# Altium schematic symbol library Schlib.SchLib: 725 symbols (part 3 of 6) (continued)
## ERJ-2RKF8252X (continued)
SMD Chip Resistor, 82.5 kOhm, ± 1%, 100 mW, 0402 [1005 Metric], Thick Film, Precision; Manufacturer: Panasonic; Manufacturer Part Number: ERJ-2RKF8252X; Voltage Rating (DC): 50V; Supplier: Mouser; Supplier Part Number: 667-ERJ-2RKF8252X; RoHS: Yes; Category: Chip SMD Resistors; Stock: 47815; Pricing: 1=0.1, 10=0.016, 50=0.016, 100=0.009, 1000=0.007, 10000=0.004 (USD); Lead Free: 5698LeadFree; ComponentLink1URL: https://datasheet.ciiva.com/16760/70260748-16760431.pdf?src-supplier=Allied+Electronics; ComponentLink1Description: https://datasheet.ciiva.com/16760/70260748-16760431.pdf?src-supplier=Allied+Electronics; ComponentLink2URL: https://datasheet.ciiva.com/28548/1694929-28548459.pdf?src-supplier=Element14; ComponentLink2Description: https://datasheet.ciiva.com/28548/1694929-28548459.pdf?src-supplier=Element14; ComponentLink3URL: https://datasheet.ciiva.com/22668/1678782-22668155.pdf?src-supplier=Element14; ComponentLink3Description: https://datasheet.ciiva.com/22668/1678782-22668155.pdf?src-supplier=Element14; ComponentLink4URL: https://datasheet.ciiva.com/30193/aoa0000ce2-30193435.pdf?src-supplier=Onlinecomponents.com; ComponentLink4Description: https://datasheet.ciiva.com/30193/aoa0000ce2-30193435.pdf?src-supplier=Onlinecomponents.com; ComponentLink5URL: https://datasheet.ciiva.com/24124/aoa0000ce2-24124663.pdf?src-supplier=Mouser; ComponentLink5Description: https://datasheet.ciiva.com/24124/aoa0000ce2-24124663.pdf?src-supplier=Mouser; ComponentLink6URL: https://datasheet.ciiva.com/9187/aoa0000ce2-9187319.pdf?src-supplier=Avnet; ComponentLink6Description: https://datasheet.ciiva.com/9187/aoa0000ce2-9187319.pdf?src-supplier=Avnet; ComponentLink7URL: https://datasheet.ciiva.com/9187/aoa0000ce2-9187321.pdf?src-supplier=Avnet; ComponentLink7Description: https://datasheet.ciiva.com/9187/aoa0000ce2-9187321.pdf?src-supplier=Avnet; ComponentLink8URL: https://datasheet.ciiva.com/22774/1678782-22774092.pdf?src-supplier=Farnell; ComponentLink8Description: https://datasheet.ciiva.com/22774/1678782-22774092.pdf?src-supplier=Farnell; Case/Package: 0402
footprint R 0402 (1005 Metric) (Chip Capacitor, Body 1.0x0.5mm, IPC High Density)
pins: 1 B, 2 A

## ERJ-2RKF8452X
designator R?  value 84.5k  (hidden comment: *)
SMD Chip Resistor, 84.5 kOhm, ± 1%, 100 mW, 0402 [1005 Metric], Thick Film, Precision; Manufacturer: Panasonic; Manufacturer Part Number: ERJ-2RKF8452X; Voltage Rating (DC): 50V; Supplier: Mouser; Supplier Part Number: 667-ERJ-2RKF8452X; RoHS: Yes; Category: Chip SMD Resistors; Stock: 108500; Pricing: 1=0.1, 10=0.016, 50=0.016, 100=0.009, 1000=0.006, 10000=0.003 (USD); Lead Free: 5697LeadFree; ComponentLink1URL: https://datasheet.ciiva.com/24025/aoa0000ce2-24025517.pdf?src-supplier=Mouser; ComponentLink1Description: https://datasheet.ciiva.com/24025/aoa0000ce2-24025517.pdf?src-supplier=Mouser; ComponentLink2URL: https://datasheet.ciiva.com/46373/1678782-46373862.pdf?src-supplier=Element14; ComponentLink2Description: https://datasheet.ciiva.com/46373/1678782-46373862.pdf?src-supplier=Element14; ComponentLink3URL: https://datasheet.ciiva.com/46373/1678782-46373863.pdf?src-supplier=Element14; ComponentLink3Description: https://datasheet.ciiva.com/46373/1678782-46373863.pdf?src-supplier=Element14; ComponentLink4URL: https://datasheet.ciiva.com/22682/1678782-22682463.pdf?src-supplier=Element14; ComponentLink4Description: https://datasheet.ciiva.com/22682/1678782-22682463.pdf?src-supplier=Element14; ComponentLink5URL: https://datasheet.ciiva.com/7861/aoa0000ce2-7861999.pdf?src-supplier=Element14; ComponentLink5Description: https://datasheet.ciiva.com/7861/aoa0000ce2-7861999.pdf?src-supplier=Element14; ComponentLink6URL: https://datasheet.ciiva.com/28540/1694929-28540714.pdf?src-supplier=Element14; ComponentLink6Description: https://datasheet.ciiva.com/28540/1694929-28540714.pdf?src-supplier=Element14; Case/Package: 0402
footprint R 0402 (1005 Metric) (Chip Capacitor, Body 1.0x0.5mm, IPC High Density)
pins: 1 B, 2 A

## ERJ-2RKF8872X
designator R?  value 88.7kR  (hidden comment: *)
SMD Chip Resistor, 88.7 kOhm, ± 1%, 100 mW, 0402 [1005 Metric], Thick Film, Precision; Manufacturer: Panasonic; Manufacturer Part Number: ERJ-2RKF8872X; Voltage Rating (DC): 50V; Supplier: Future Electronics; Supplier Part Number: 9176712; RoHS: Yes; Category: Chip SMD Resistors; Stock: 90000; Pricing: 10000=0.0033, 40000=0.0031, 200000=0.0029, 400000=0.0028, 1250000=0.0026 (USD); Lead Free: 5697LeadFree; ComponentLink1URL: https://datasheet.ciiva.com/9187/aoa0000ce2-9187162.pdf?src-supplier=Avnet; ComponentLink1Description: https://datasheet.ciiva.com/9187/aoa0000ce2-9187162.pdf?src-supplier=Avnet; ComponentLink2URL: https://datasheet.ciiva.com/24069/aoa0000ce2-24069327.pdf?src-supplier=Mouser; ComponentLink2Description: https://datasheet.ciiva.com/24069/aoa0000ce2-24069327.pdf?src-supplier=Mouser; Case/Package: 0402
footprint R 0402 (1005 Metric) (Chip Capacitor, Body 1.0x0.5mm, IPC High Density)
pins: 1 B, 2 A

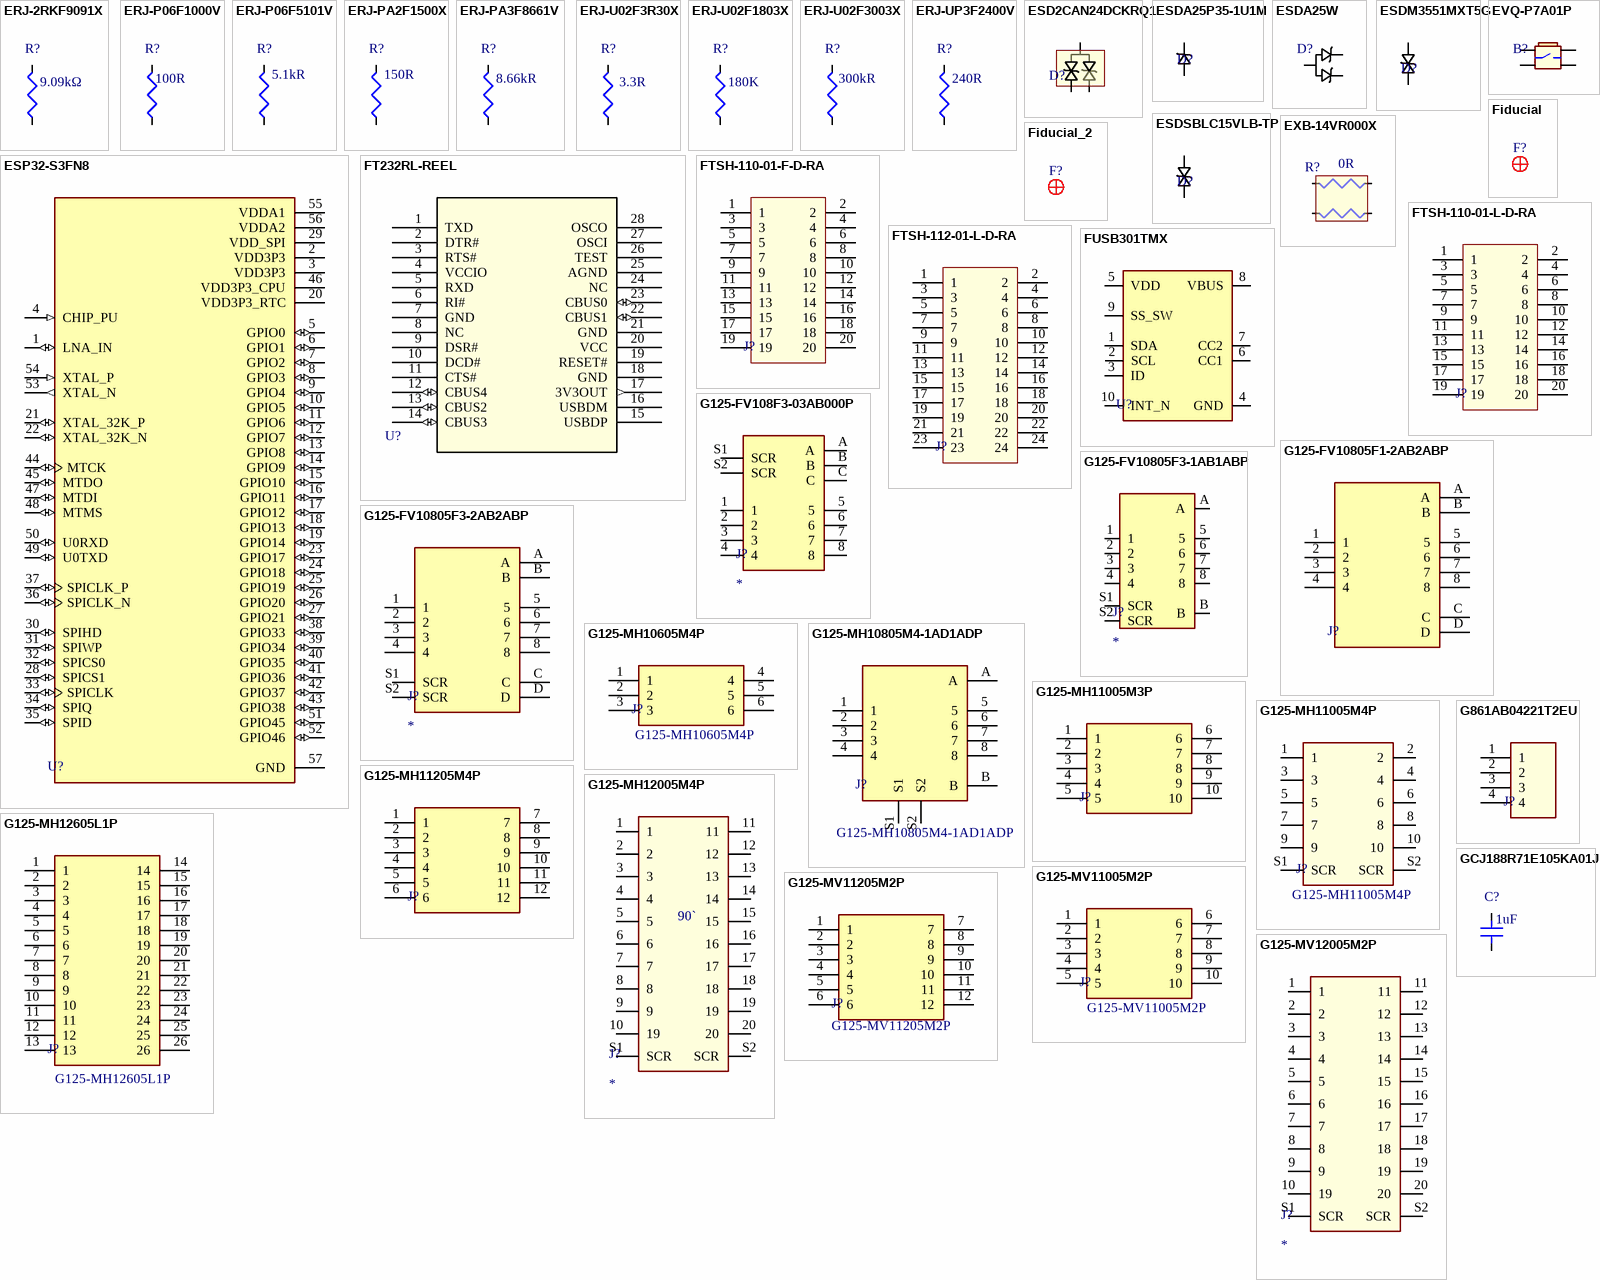
[diagram p10: symbols ERJ-2RKF9091X to GCJ188R71E105KA01J]

## ERJ-2RKF9091X
designator R?  value 9.09kΩ  (hidden comment: *)
Res Thick Film 0402 9.09K Ohm 1% 0.1W(1/10W) ±100ppm/°C Molded SMD Punched Carrier T/R; Manufacturer: Panasonic; Manufacturer Part Number: ERJ-2RKF9091X; Manufacturer Lifecycle Status: ACTIVE; Part Series: Precision Thick Film Chip Resistors; Max Power Dissipation: 100mW; Voltage Rating: 50V; Supplier: Arrow Electronics; Supplier Part Number: ERJ-2RKF9091X; RoHS: Compliant; Category: Chip SMD Resistors; Stock: 10000; Pricing: 10000=0.0039 (USD); Case/Package: 0402; Case Code (Imperial): 0402; China RoHS: Non-Compliant; Composition: Thick Film; Contact Plating: Tin; Depth: 500µm; Features: Automotive AEC-Q200; Height: 350µm; Length: 1mm; Lifecycle Status: Production; Max Operating Temperature: 155°C; Military Standard: Not; Min Operating Temperature: -55°C; Mounting Technology: Surface Mount; Number of Terminals: 2; Number of Terminations: 2; Packaging: Cut Tape; Power Dissipation: 100mW; Power Rating: 100mW; REACH SVHC: Yes; Schedule B: 8533210045, 8533210045|8533210045|8533210045|8533210045|8533210045|8533210045|8533210045|8533210045, 8533210045|8533210045|8533210045|8533210045|8533210045|8533210045|8533210045|8533210045|8533210045, 8533210045|8533210045|8533210045|8533210045|8533210045|8533210045|8533210045|8533210045|8533210045|8533210045; Temperature Coefficient: 100ppm/°C; Termination: SMD/SMT; Tolerance: 1%; Voltage Rating (DC): 50V; Width: 500µm; Working Voltage: 50V; ComponentLink1URL: https://datasheet.octopart.com:443/ERJ-2RKF9091X-Panasonic-datasheet-82288794.pdf?src-supplier=Panasonic; ComponentLink1Description: https://datasheet.octopart.com:443/ERJ-2RKF9091X-Panasonic-datasheet-82288794.pdf?src-supplier=Panasonic; ComponentLink2URL: https://datasheet.octopart.com:443/ERJ-2RKF9091X-Panasonic-datasheet-13266541.pdf?src-supplier=RS+(Formerly+Allied+Electronics); ComponentLink2Description: https://datasheet.octopart.com:443/ERJ-2RKF9091X-Panasonic-datasheet-13266541.pdf?src-supplier=RS+(Formerly+Allied+Electronics); ComponentLink3URL: https://datasheet.octopart.com:443/ERJ-2RKF9091X-Panasonic-datasheet-10025800.pdf?src-supplier=Future+Electronics; ComponentLink3Description: https://datasheet.octopart.com:443/ERJ-2RKF9091X-Panasonic-datasheet-10025800.pdf?src-supplier=Future+Electronics; ComponentLink4URL: https://datasheet.octopart.com:443/ERJ-2RKF9091X-Panasonic-datasheet-8853621.pdf?src-supplier=Future+Electronics; ComponentLink4Description: https://datasheet.octopart.com:443/ERJ-2RKF9091X-Panasonic-datasheet-8853621.pdf?src-supplier=Future+Electronics; ComponentLink5URL: https://datasheet.octopart.com:443/ERJ-2RKF9091X-Panasonic-datasheet-5313456.pdf?src-supplier=Future+Electronics; ComponentLink5Description: https://datasheet.octopart.com:443/ERJ-2RKF9091X-Panasonic-datasheet-5313456.pdf?src-supplier=Future+Electronics; ComponentLink6URL: https://datasheet.octopart.com:443/ERJ-2RKF9091X-Panasonic-datasheet-48891056.pdf?src-supplier=Newark; ComponentLink6Description: https://datasheet.octopart.com:443/ERJ-2RKF9091X-Panasonic-datasheet-48891056.pdf?src-supplier=Newark; ComponentLink7URL: https://datasheet.octopart.com:443/ERJ-2RKF9091X-Panasonic-datasheet-136608610.pdf?src-supplier=Newark; ComponentLink7Description: https://datasheet.octopart.com:443/ERJ-2RKF9091X-Panasonic-datasheet-136608610.pdf?src-supplier=Newark; ComponentLink8URL: https://datasheet.octopart.com:443/ERJ-2RKF9091X-Panasonic-datasheet-154766169.pdf?src-supplier=Master+Electronics; ComponentLink8Description: https://datasheet.octopart.com:443/ERJ-2RKF9091X-Panasonic-datasheet-154766169.pdf?src-supplier=Master+Electronics; ComponentLink9URL: https://datasheet.octopart.com:443/ERJ2RKF9091X-Panasonic-datasheet-188592431.pdf?src-supplier=TME; ComponentLink9Description: https://datasheet.octopart.com:443/ERJ2RKF9091X-Panasonic-datasheet-188592431.pdf?src-supplier=TME; ComponentLink10URL: https://datasheet.octopart.com/ERJ-2RKF9091X-Panasonic-datasheet-78375410.pdf; ComponentLink10Description: https://datasheet.octopart.com/ERJ-2RKF9091X-Panasonic-datasheet-78375410.pdf; ComponentLink11URL: https://datasheet.octopart.com:443/ERJ-2RKF9091X-Panasonic---ECG-datasheet-15994758.pdf?src-supplier=Farnell; ComponentLink11Description: https://datasheet.octopart.com:443/ERJ-2RKF9091X-Panasonic---ECG-datasheet-15994758.pdf?src-supplier=Farnell; ComponentLink12URL: https://datasheet.octopart.com:443/ERJ-2RKF9091X-Panasonic-datasheet-11542829.pdf?src-supplier=Arrow+Electronics; ComponentLink12Description: https://datasheet.octopart.com:443/ERJ-2RKF9091X-Panasonic-datasheet-11542829.pdf?src-supplier=Arrow+Electronics; ComponentLink13URL: https://datasheet.octopart.com:443/ERJ-2RKF9091X-Panasonic-datasheet-118621.pdf?src-supplier=DigiKey; ComponentLink13Description: https://datasheet.octopart.com:443/ERJ-2RKF9091X-Panasonic-datasheet-118621.pdf?src-supplier=DigiKey; ComponentLink14URL: https://datasheet.octopart.com:443/ERJ-2RKF9091X-Panasonic-datasheet-41391857.pdf?src-supplier=Electro+Sonic; ComponentLink14Description: https://datasheet.octopart.com:443/ERJ-2RKF9091X-Panasonic-datasheet-41391857.pdf?src-supplier=Electro+Sonic
footprint R 0402 (1005 Metric) (Chip Capacitor, Body 1.0x0.5mm, IPC High Density)
pins: 1 B, 2 A

## ERJ-P06F1000V
designator R?  value 100R  (hidden comment: *)
SMD Chip Resistor, 100 Ohm, ± 1%, 500 mW, 0805 [2012 Metric], Thick Film, Anti-Surge; Manufacturer: Panasonic; Manufacturer Part Number: ERJ-P06F1000V; Supplier: Mouser; Supplier Part Number: 667-ERJ-P06F1000V; RoHS: Yes; Category: Chip SMD Resistors; Stock: 72125; Pricing: 1=0.18, 10=0.066, 50=0.066, 100=0.041, 1000=0.028, 10000=0.018 (USD); ComponentLink1URL: https://datasheet.ciiva.com/11817/0900766b812cb812-11817182.pdf?src-supplier=Rs; ComponentLink1Description: https://datasheet.ciiva.com/11817/0900766b812cb812-11817182.pdf?src-supplier=Rs; ComponentLink2URL: https://datasheet.ciiva.com/30103/aoa0000ce4-30103141.pdf?src-supplier=Onlinecomponents.com; ComponentLink2Description: https://datasheet.ciiva.com/30103/aoa0000ce4-30103141.pdf?src-supplier=Onlinecomponents.com; ComponentLink3URL: https://datasheet.ciiva.com/48426/erjp-series-eng-tds-48426777.pdf?src-supplier=Distrelec; ComponentLink3Description: https://datasheet.ciiva.com/48426/erjp-series-eng-tds-48426777.pdf?src-supplier=Distrelec; ComponentLink4URL: https://datasheet.ciiva.com/24070/aoa0000ce4-64075-24070038.pdf?src-supplier=Mouser; ComponentLink4Description: https://datasheet.ciiva.com/24070/aoa0000ce4-64075-24070038.pdf?src-supplier=Mouser; ComponentLink5URL: https://datasheet.ciiva.com/9186/aoa0000ce4-9186922.pdf?src-supplier=Avnet; ComponentLink5Description: https://datasheet.ciiva.com/9186/aoa0000ce4-9186922.pdf?src-supplier=Avnet; ComponentLink6URL: https://datasheet.ciiva.com/22758/1801181-22758282.pdf?src-supplier=Farnell; ComponentLink6Description: https://datasheet.ciiva.com/22758/1801181-22758282.pdf?src-supplier=Farnell; ComponentLink7URL: https://datasheet.ciiva.com/22758/1801181-22758283.pdf?src-supplier=Farnell; ComponentLink7Description: https://datasheet.ciiva.com/22758/1801181-22758283.pdf?src-supplier=Farnell; ComponentLink8URL: https://datasheet.ciiva.com/7830/1790600-7830815.pdf?src-supplier=Element14; ComponentLink8Description: https://datasheet.ciiva.com/7830/1790600-7830815.pdf?src-supplier=Element14; Case/Package: 0805
footprint R 0805
pins: 1 B, 2 A

## ERJ-P06F5101V
designator R?  value 5.1kR  (hidden comment: *)
Res Thick Film 0805 5.1K Ohm 1% 0.25W ±100ppm/°C Molded SMD Punched Carrier T/R; Manufacturer: Panasonic; Manufacturer Part Number: ERJ-P06F5101V; Power Rating: 500mW; Voltage Rating: 400V; Voltage Rating (DC): 150V; Supplier: Digikey; Supplier Part Number: 10-ERJ-P06F5101VCT-ND; RoHS: Yes; Category: Chip SMD Resistors; Stock: 2603; Pricing: 1=0.2, 10=0.098, 50=0.0658, 100=0.0562, 500=0.0403, 1000=0.03547 (USD); Mounting Technology: Surface Mount; Case/Package: 0805; Pins: 2; Case Code (Imperial): 0805; Case Code (Metric): 2012; Min Operating Temperature: -55°C; Max Operating Temperature: 155°C; Tolerance: 1%; Packaging: Tape and Reel; Package Quantity: 5000; Resistor Type: Thick Film; Termination: SMD/SMT; Temperature Coefficient: 100ppm/°C; Series: ERJ-P06; Resistance Tolerance: 1%; Technology: THICK FILM; Length: 2mm; Width: 1.2mm; Height: 0.6mm; Depth: 1.25mm; Reach SVHC Compliant: No; RoHS Compliant: Yes; ComponentLink1URL: https://datasheet.ciiva.com/11811/0900766b812cb812-11811360.pdf?src-supplier=Rs; ComponentLink1Description: https://datasheet.ciiva.com/11811/0900766b812cb812-11811360.pdf?src-supplier=Rs; ComponentLink2URL: https://datasheet.ciiva.com/7836/1790600-7836650.pdf?src-supplier=Element14; ComponentLink2Description: https://datasheet.ciiva.com/7836/1790600-7836650.pdf?src-supplier=Element14; ComponentLink3URL: https://datasheet.ciiva.com/22705/1801181-22705413.pdf?src-supplier=Element14; ComponentLink3Description: https://datasheet.ciiva.com/22705/1801181-22705413.pdf?src-supplier=Element14; ComponentLink4URL: https://datasheet.ciiva.com/24064/aoa0000ce4-64075-24064760.pdf?src-supplier=Mouser; ComponentLink4Description: https://datasheet.ciiva.com/24064/aoa0000ce4-64075-24064760.pdf?src-supplier=Mouser
footprint R 0805
pins: 1 B, 2 A

## ERJ-PA2F1500X
designator R?  value 150R  (hidden comment: *)
Res Thick Film 0402 150 Ohm 1% 0.2W(1/5W) ±100ppm/C Pad SMD Automotive T/R; Manufacturer: Panasonic; Manufacturer Part Number: ERJ-PA2F1500X; Power Rating: 200mW; Voltage Rating: 50V; Temperature Coefficient: 100ppm/°C; Supplier: Mouser; Supplier Part Number: 667-ERJ-PA2F1500X; RoHS: Yes; Category: Chip SMD Resistors; Stock: 14223; Pricing: 1=0.21, 10=0.094, 50=0.094, 100=0.042, 1000=0.029, 10000=0.023 (USD); Case/Package: 0402; Case Code (Metric): 1005; Case Code (Imperial): 0402; Min Operating Temperature: -55°C; Max Operating Temperature: 155°C; Packaging: Cut Tape; Resistor Type: Thick Film; Number of Terminations: 2; Tolerance: 1%; Max Power Dissipation: 200mW; Voltage Rating (DC): 50V; Features: Automotive AEC-Q200; Series: ERJ; Resistance Tolerance: 1%; Ratings: AEC-Q200; RoHS Compliant: Yes; Reach SVHC Compliant: Unknown; ComponentLink1URL: http://www.farnell.com/datasheets/2051174.pdf?src-supplier=Element14; ComponentLink1Description: http://www.farnell.com/datasheets/2051174.pdf?src-supplier=Element14; ComponentLink2URL: https://industrial.panasonic.com/ww/system/files/data/download/catalog/id_fixed-resistors_e_1.pdf?src-supplier=Digi-Key; ComponentLink2Description: https://industrial.panasonic.com/ww/system/files/data/download/catalog/id_fixed-resistors_e_1.pdf?src-supplier=Digi-Key
footprint R 0402 (1005 Metric) (Chip Capacitor, Body 1.0x0.5mm, IPC High Density)
pins: 1 B, 2 A

## ERJ-PA3F8661V
designator R?  value 8.66kR  (hidden comment: *)
SMD Chip Resistor, 8.66 kOhm, ± 1%, 250 mW, 0603 [1608 Metric], Thick Film, Anti-Surge; Manufacturer: Panasonic; Manufacturer Part Number: ERJ-PA3F8661V; Power Rating: 250mW; Voltage Rating: 150V; Temperature Coefficient: 100ppm/°C; Supplier: Mouser; Supplier Part Number: 667-ERJ-PA3F8661V; RoHS: No; Category: Chip SMD Resistors; Stock: 8947; Pricing: 1=0.15, 10=0.13, 50=0.13, 100=0.057, 1000=0.057, 10000=0.016 (USD); Case/Package: 0603; Case Code (Metric): 1608; Case Code (Imperial): 0603; Min Operating Temperature: -55°C; Max Operating Temperature: 155°C; Packaging: Tape and Reel; Resistor Type: Thick Film; Number of Terminations: 2; Tolerance: 1%; Max Power Dissipation: 250mW; Voltage Rating (DC): 150V; Features: Automotive AEC-Q200; Series: ERJ; Resistance Tolerance: 1%; Length: 0.063inch; Width: 0.031inch; Height: 0.018inch; Reach SVHC Compliant: Unknown; ComponentLink1URL: http://www.farnell.com/datasheets/2254497.pdf?src-supplier=Farnell; ComponentLink1Description: http://www.farnell.com/datasheets/2254497.pdf?src-supplier=Farnell; ComponentLink2URL: https://datasheet.octopart.com/ERJ-PA3F8661V-Panasonic-datasheet-62334979.pdf?src-supplier=Element14; ComponentLink2Description: https://datasheet.octopart.com/ERJ-PA3F8661V-Panasonic-datasheet-62334979.pdf?src-supplier=Element14; ComponentLink3URL: https://datasheet.octopart.com/ERJ-PA3F8661V-Panasonic-datasheet-136608609.pdf?src-supplier=Farnell; ComponentLink3Description: https://datasheet.octopart.com/ERJ-PA3F8661V-Panasonic-datasheet-136608609.pdf?src-supplier=Farnell; ComponentLink4URL: http://datasheet.octopart.com/ERJ-PA3F8661V-Panasonic-datasheet-68299097.pdf?src-supplier=Mouser; ComponentLink4Description: http://datasheet.octopart.com/ERJ-PA3F8661V-Panasonic-datasheet-68299097.pdf?src-supplier=Mouser; ComponentLink5URL: http://datasheet.octopart.com/ERJ-PA3F8661V-Panasonic-datasheet-68299097.pdf?src-supplier=Newark; ComponentLink5Description: http://datasheet.octopart.com/ERJ-PA3F8661V-Panasonic-datasheet-68299097.pdf?src-supplier=Newark; ComponentLink6URL: http://datasheet.octopart.com/ERJ-PA3F8661V-Panasonic-datasheet-68299097.pdf?src-supplier=Avnet; ComponentLink6Description: http://datasheet.octopart.com/ERJ-PA3F8661V-Panasonic-datasheet-68299097.pdf?src-supplier=Avnet; ComponentLink7URL: http://datasheet.octopart.com/ERJ-PA3F8661V-Panasonic-datasheet-68299097.pdf?src-supplier=Onlinecomponents.com; ComponentLink7Description: http://datasheet.octopart.com/ERJ-PA3F8661V-Panasonic-datasheet-68299097.pdf?src-supplier=Onlinecomponents.com; ComponentLink8URL: http://datasheet.octopart.com/ERJ-PA3F8661V-Panasonic-datasheet-68299097.pdf?src-supplier=Digikey; ComponentLink8Description: http://datasheet.octopart.com/ERJ-PA3F8661V-Panasonic-datasheet-68299097.pdf?src-supplier=Digikey; ComponentLink9URL: http://datasheet.octopart.com/ERJ-PA3F8661V-Panasonic-datasheet-68299097.pdf?src-supplier=Electro+Sonic; ComponentLink9Description: http://datasheet.octopart.com/ERJ-PA3F8661V-Panasonic-datasheet-68299097.pdf?src-supplier=Electro+Sonic
footprint R 0603 (1608 Metric)
pins: 1 B, 2 A

## ERJ-U02F3R30X
designator R?  value 3.3R  (hidden comment: *)
Res 3.3 Ohm 1% 1/10W 0402 SMD; Manufacturer: Panasonic; Manufacturer Part Number: ERJ-U02F3R30X; Supplier: Digikey; Supplier Part Number: 10-ERJ-U02F3R30XCT-ND; RoHS: No; Category: Chip SMD Resistors; Stock: 24560; Pricing: 1=0.13, 10=0.061, 50=0.0396, 100=0.0336, 500=0.02366, 1000=0.02061, 5000=0.01549 (USD); Case/Package: 0402
footprint R 0402 (1005 Metric) (Chip Capacitor, Body 1.0x0.5mm, IPC High Density)
pins: 1 B, 2 A

## ERJ-U02F1803X
designator R?  value 180K  (hidden comment: *)
Res Thick Film 0402 180K Ohm 1% 0.1W(1/10W) ±200ppm/C Sulfur Resistant Pad SMD Automotive T/R; Manufacturer: Panasonic; Manufacturer Part Number: ERJ-U02F1803X; Supplier: Mouser; Supplier Part Number: 667-ERJ-U02F1803X; RoHS: Yes; Category: Chip SMD Resistors; Stock: 35608; Pricing: 1=0.12, 10=0.06, 50=0.06, 100=0.027, 1000=0.019, 10000=0.013 (USD); ComponentLink1URL: https://datasheet.ciiva.com/24211/ras-erj-u-267552-24211769.pdf?src-supplier=Mouser; ComponentLink1Description: https://datasheet.ciiva.com/24211/ras-erj-u-267552-24211769.pdf?src-supplier=Mouser; ComponentLink2URL: https://datasheet.ciiva.com/22730/1783557-22730523.pdf?src-supplier=Element14; ComponentLink2Description: https://datasheet.ciiva.com/22730/1783557-22730523.pdf?src-supplier=Element14; ComponentLink3URL: https://datasheet.ciiva.com/22730/1783557-22730525.pdf?src-supplier=Element14; ComponentLink3Description: https://datasheet.ciiva.com/22730/1783557-22730525.pdf?src-supplier=Element14; ComponentLink4URL: https://datasheet.ciiva.com/25720/1783557-25720873.pdf?src-supplier=Farnell; ComponentLink4Description: https://datasheet.ciiva.com/25720/1783557-25720873.pdf?src-supplier=Farnell
footprint R 0402 (1005 Metric) (Chip Capacitor, Body 1.0x0.5mm, IPC High Density)
pins: 1 B, 2 A

## ERJ-U02F3003X
designator R?  value 300kR  (hidden comment: *)
SMD Chip Resistor, 300 kOhm, ± 1%, 100 mW, 0402 [1005 Metric], Thick Film, Anti-Sulfur; Manufacturer: Panasonic; Manufacturer Part Number: ERJ-U02F3003X; Power Rating: 100mW; Voltage Rating: 50V; Temperature Coefficient: 200ppm/°C; Current Rating: 1A; Supplier: Mouser; Supplier Part Number: 667-ERJ-U02F3003X; RoHS: Yes; Category: Chip SMD Resistors; Stock: 23299; Pricing: 1=0.12, 10=0.037, 50=0.037, 100=0.032, 1000=0.02, 10000=0.014 (USD); Mounting Technology: Surface Mount; Case/Package: 0402; Case Code (Imperial): 0402; Case Code (Metric): 1005; Weight: 2.8E-05oz; Min Operating Temperature: -55°C; Max Operating Temperature: 155°C; Packaging: Tape and Reel; Tolerance: 1%; Package Quantity: 10000; Termination: SMD/SMT; Series: ERJ-U02; Length: 1mm; Width: 0.5mm; Height: 0.35mm; ComponentLink1URL: https://datasheet.ciiva.com/24185/ras-erj-u-267552-24185053.pdf?src-supplier=Mouser; ComponentLink1Description: https://datasheet.ciiva.com/24185/ras-erj-u-267552-24185053.pdf?src-supplier=Mouser
footprint R 0402 (1005 Metric) (Chip Capacitor, Body 1.0x0.5mm, IPC High Density)
pins: 1 B, 2 A

## ERJ-UP3F2400V
designator R?  value 240R  (hidden comment: *)
Res Thick Film 0603 240 Ohm 1% 0.25W(1/4W) ±100ppm/C Sulfur Resistant Pad SMD Automotive T/R; Manufacturer: Panasonic; Manufacturer Part Number: ERJ-UP3F2400V; Supplier: Mouser; Supplier Part Number: 667-ERJ-UP3F2400V; RoHS: No; Category: Chip SMD Resistors; Stock: 16726; Pricing: 1=0.21, 10=0.098, 50=0.098, 100=0.044, 1000=0.031, 10000=0.023 (USD); ComponentLink1URL: http://datasheet.octopart.com/ERJ-UP3F2400V-Panasonic-datasheet-145548814.pdf?src-supplier=Digikey; ComponentLink1Description: http://datasheet.octopart.com/ERJ-UP3F2400V-Panasonic-datasheet-145548814.pdf?src-supplier=Digikey; ComponentLink2URL: http://datasheet.octopart.com/ERJ-UP3F2400V-Panasonic-datasheet-145548814.pdf?src-supplier=Farnell; ComponentLink2Description: http://datasheet.octopart.com/ERJ-UP3F2400V-Panasonic-datasheet-145548814.pdf?src-supplier=Farnell; ComponentLink3URL: http://datasheet.octopart.com/ERJ-UP3F2400V-Panasonic-datasheet-145548814.pdf?src-supplier=Mouser; ComponentLink3Description: http://datasheet.octopart.com/ERJ-UP3F2400V-Panasonic-datasheet-145548814.pdf?src-supplier=Mouser; ComponentLink4URL: http://datasheet.octopart.com/ERJ-UP3F2400V-Panasonic-datasheet-145548814.pdf?src-supplier=Newark; ComponentLink4Description: http://datasheet.octopart.com/ERJ-UP3F2400V-Panasonic-datasheet-145548814.pdf?src-supplier=Newark; ComponentLink5URL: http://datasheet.octopart.com/ERJ-UP3F2400V-Panasonic-datasheet-145548814.pdf?src-supplier=Avnet; ComponentLink5Description: http://datasheet.octopart.com/ERJ-UP3F2400V-Panasonic-datasheet-145548814.pdf?src-supplier=Avnet; ComponentLink6URL: http://datasheet.octopart.com/ERJ-UP3F2400V-Panasonic-datasheet-145548814.pdf?src-supplier=Allied+Electronics; ComponentLink6Description: http://datasheet.octopart.com/ERJ-UP3F2400V-Panasonic-datasheet-145548814.pdf?src-supplier=Allied+Electronics; ComponentLink7URL: http://datasheet.octopart.com/ERJ-UP3F2400V-Panasonic-datasheet-145548814.pdf?src-supplier=Onlinecomponents.com; ComponentLink7Description: http://datasheet.octopart.com/ERJ-UP3F2400V-Panasonic-datasheet-145548814.pdf?src-supplier=Onlinecomponents.com; ComponentLink8URL: http://datasheet.octopart.com/ERJ-UP3F2400V-Panasonic-datasheet-145548814.pdf?src-supplier=Verical; ComponentLink8Description: http://datasheet.octopart.com/ERJ-UP3F2400V-Panasonic-datasheet-145548814.pdf?src-supplier=Verical; ComponentLink9URL: http://datasheet.octopart.com/ERJ-UP3F2400V-Panasonic-datasheet-145548814.pdf?src-supplier=Electro+Sonic; ComponentLink9Description: http://datasheet.octopart.com/ERJ-UP3F2400V-Panasonic-datasheet-145548814.pdf?src-supplier=Electro+Sonic; Case/Package: 0603
footprint R 0603 (1608 Metric)
pins: 1 B, 2 A

## ESD2CAN24DCKRQ1
designator D?  (value not drawn)
Automotive, dual, 3-pF, ±24-V, ±30-kV ESD protection diode for in-vehicle networks 3-SC70 -55 to 150; Manufacturer: Texas Instruments; Manufacturer Part Number: ESD2CAN24DCKRQ1; Supplier: Mouser; Supplier Part Number: 595-ESD2CAN24DCKRQ1; RoHS: No; Category: Integrated Circuits (ICs); Stock: 13957; Pricing: 1=0.32, 10=0.189, 50=0.189, 100=0.145, 1000=0.129, 10000=0.116 (USD); Pins: 3NUMBER; Length: 2mm; Width: 1.25mm; Height: 1.1mm; Thickness: 900um
footprint SOT-323, SC-70
pins: 1 I/O, 2 I/O, 3 GND

## ESDA25P35-1U1M
designator D?  (value not drawn)
Diode TVS Single Uni-Dir 22V 1400W 2-Pin QFN T/R; Manufacturer: STMicroelectronics; Manufacturer Part Number: ESDA25P35-1U1M; Number of Unidirectional Channels: 1; Min Breakdown Voltage: 23.3V; Peak Pulse Current: 35A; Peak Pulse Power: 1.4kW; Power Line Protection: No; Diode Type: ZENER; Supplier: Mouser; Supplier Part Number: 511-ESDA25P35-1U1M; RoHS: Yes; Category: TVS Diodes; Stock: 147435; Pricing: 1=0.42, 10=0.35, 50=0.35, 100=0.247, 1000=0.14, 10000=0.12 (USD); Mounting Technology: Surface Mount; Case/Package: 1610; Pins: 2; Min Operating Temperature: -55°C; Max Operating Temperature: 150°C; Packaging: Cut Tape; Reverse Standoff Voltage: 22V; Series: ESDA; RoHS Compliant: Yes; ComponentLink1URL: http://www.farnell.com/datasheets/2236209.pdf?src-supplier=Farnell; ComponentLink1Description: http://www.farnell.com/datasheets/2236209.pdf?src-supplier=Farnell; ComponentLink2URL: http://www.farnell.com/datasheets/2236209.pdf?src-supplier=Newark; ComponentLink2Description: http://www.farnell.com/datasheets/2236209.pdf?src-supplier=Newark; ComponentLink3URL: http://www.farnell.com/datasheets/2236209.pdf?src-supplier=Element14; ComponentLink3Description: http://www.farnell.com/datasheets/2236209.pdf?src-supplier=Element14; ComponentLink4URL: http://www.st.com/content/ccc/resource/technical/document/datasheet/group3/e4/43/53/b9/4e/8a/40/bb/DM00312034/files/DM00312034.pdf/jcr:content/translations/en.DM00312034.pdf?src-supplier=Digikey; ComponentLink4Description: http://www.st.com/content/ccc/resource/technical/document/datasheet/group3/e4/43/53/b9/4e/8a/40/bb/DM00312034/files/DM00312034.pdf/jcr:content/translations/en.DM00312034.pdf?src-supplier=Digikey; ComponentLink5URL: https://datasheet.octopart.com/ESDA25P35-1U1M-STMicroelectronics-datasheet-95509471.pdf?src-supplier=Future+Electronics; ComponentLink5Description: https://datasheet.octopart.com/ESDA25P35-1U1M-STMicroelectronics-datasheet-95509471.pdf?src-supplier=Future+Electronics
footprint ESDA25P35-1U1M
pins: 1 C, 2 A

## ESDA25W
designator D?  (value not drawn)
ESDA Series 2 Channel 25 V 65 pF SMT Uni-Directional Transil Array - SOT-323; Manufacturer: STMicroelectronics; Manufacturer Part Number: ESDA25W; Supplier: Mouser; Supplier Part Number: 511-ESDA25W; RoHS: Yes; Category: TVS Diodes; Stock: 71426; Pricing: 1=0.47, 10=0.399, 50=0.399, 100=0.278, 1000=0.176, 10000=0.132 (USD)
footprint SOT-323, SC-70
pins: 1 C1, 2 C2, 3 A

## ESDM3551MXT5G
designator D?  (value not drawn)
ESD Protection Diode, CC and SBU Protection (5.5 V – USB 3.x), 21 pF 5.5V ESD-Surge in 0201; Manufacturer: ON Semiconductor; Manufacturer Part Number: ESDM3551MXT5G; Supplier: Avnet; Supplier Part Number: ESDM3551MXT5G; RoHS: Yes; Category: ESD and Circuit Protection ICs; Stock: 6634000; Pricing: 8170=0.04529, 8200=0.04406, 17000=0.04284, 41000=0.04162, 82000=0.04039, 410000=0.03917, 820000=0.03794 (USD); ComponentLink1URL: http://www.farnell.com/datasheets/2571948.pdf?src-supplier=Farnell; ComponentLink1Description: http://www.farnell.com/datasheets/2571948.pdf?src-supplier=Farnell; ComponentLink2URL: https://www.onsemi.com/pub/Collateral/ESDM3551-D.PDF?src-supplier=Digi-Key; ComponentLink2Description: https://www.onsemi.com/pub/Collateral/ESDM3551-D.PDF?src-supplier=Digi-Key; ComponentLink3URL: http://www.farnell.com/datasheets/2571948.pdf?src-supplier=Newark; ComponentLink3Description: http://www.farnell.com/datasheets/2571948.pdf?src-supplier=Newark
footprint ESDM3551MXT5G
pins: 1, 2

## ESDSBLC15VLB-TP
designator D?  (value not drawn)
Trans Voltage Suppressor Diode, 140W, 15V V(RWM), Bidirectional, 1 Element, Silicon; Manufacturer: MCC; Manufacturer Part Number: ESDSBLC15VLB-TP; Breakdown Voltage: 17.75V; Clamping Voltage: 23V; Max Breakdown Voltage: 20V; Min Breakdown Voltage: 15.5V; Number of Elements: 1; Peak Reverse Current: 100nA; Supplier: DigiKey; Supplier Part Number: 353-ESDSBLC15VLB-TPCT-ND; Category: TVS Diodes; Stock: 6031; Pricing: 1=0.23, 10=0.143, 100=0.089, 500=0.06522, 1000=0.0575, 2000=0.05099, 5000=0.04391 (USD); Lifecycle Status: Production; Max Operating Temperature: 125°C; Min Operating Temperature: -40°C; Number of Terminals: 2; Peak Pulse Power: 140W; Polarity: Bidirectional; Reverse Standoff Voltage: 15V
footprint Diode 0402
pins: 1, 2

## ESP32-S3FN8
designator U?  (value not drawn)
Manufacturer: Espressif Systems; Manufacturer Part Number: ESP32-S3FN8; Supplier: Mouser; Supplier Part Number: 356-ESP32-S3FN8; RoHS: No; Stock: 15779; Pricing: 1=2.28, 10=2.28, 50=2.28, 100=2.28, 1000=2.28, 10000=2.28 (USD)
footprint ESP32-S3FN8
pins: 1 LNA_IN (io), 2 VDD3P3 (power), 3 VDD3P3 (power), 4 CHIP_PU (in), 5 GPIO0 (io), 6 GPIO1 (io), 7 GPIO2 (io), 8 GPIO3 (io), 9 GPIO4 (io), 10 GPIO5 (io), 11 GPIO6 (io), 12 GPIO7 (io), 13 GPIO8 (io), 14 GPIO9 (io), 15 GPIO10 (io), 16 GPIO11 (io), 17 GPIO12 (io), 18 GPIO13 (io), 19 GPIO14 (io), 20 VDD3P3_RTC (power), 21 XTAL_32K_P (io), 22 XTAL_32K_N (io), 23 GPIO17 (io), 24 GPIO18 (io), 25 GPIO19 (io), 26 GPIO20 (io), 27 GPIO21 (io), 28 SPICS1 (io), 29 VDD_SPI (power), 30 SPIHD (io), 31 SPIWP (io), 32 SPICS0 (io), 33 SPICLK (io), 34 SPIQ (io), 35 SPID (io), 36 SPICLK_N (io), 37 SPICLK_P (io), 38 GPIO33 (io), 39 GPIO34 (io), 40 GPIO35 (io), 41 GPIO36 (io), 42 GPIO37 (io), 43 GPIO38 (io), 44 MTCK (io), 45 MTDO (io), 46 VDD3P3_CPU (power), 47 MTDI (io), 48 MTMS (io), 49 U0TXD (io), 50 U0RXD (io), 51 GPIO45 (io), 52 GPIO46 (io), 53 XTAL_N (out), 54 XTAL_P (in), 55 VDDA1 (power), 56 VDDA2 (power), 57 GND (power)

## EVQ-P7A01P
designator B?  (value not drawn)
Switch Tactile N.O. SPST Rectangular Button Gull Wing 0.05A 12VDC 2.2N SMD Embossed T/R; Manufacturer: Panasonic; Manufacturer Part Number: EVQ-P7A01P; Mechanical Life: 100000Cycles; Actuator Color: Black; Max Voltage Rating (DC): 12V; Contact Resistance: 500mR; Illumination Type: Non-Illuminated; Contact Current Rating: 50mA; Switch Travel: 0.2mm; Switch Function: Off-Mom; Actuator Length: 0.65mm; Supplier: Rs; Supplier Part Number: 1789019; RoHS: Yes; Category: Tactile Switches; Stock: 940; Pricing: 1=622.86000 (GBP); Mounting Technology: Surface Mount; Case/Package: SMD/SMT; Min Operating Temperature: -20°C; Max Operating Temperature: 70°C; Throw Configuration: SPST; Operating Force: 2.2N; Packaging: Tape and Reel; Package Quantity: 5000; Termination: Gull Wing; Electrical Life: 100000Cycles; Orientation: Right Angle; Series: EVQP7; Radiation Hardening: No; Lead Free: Lead Free; ComponentLink1URL: https://datasheet.ciiva.com/30108/atk0000ce20-30108102.pdf?src-supplier=Onlinecomponents.com; ComponentLink1Description: https://datasheet.ciiva.com/30108/atk0000ce20-30108102.pdf?src-supplier=Onlinecomponents.com
footprint EVQ-P7A01P
pins: 1 NO_1, 2 NO_2, 3 COM_1, 4 COM_2

## EXB-14VR000X
designator R?  value 0R  (hidden comment: *)
Res Thick Film Array 0 Ohm ISOL Molded 4-Pin 0302(2 X 0201) Convex SMD Punched Carrier T/R; Manufacturer: Panasonic; Manufacturer Part Number: EXB-14VR000X; Temperature Coefficient: 200ppm/°C; Number of Contacts: 4NUMBER; Voltage Rating (DC): 25V; Tolerance: 5%; Supplier: Mouser; Supplier Part Number: 667-EXB-14VR000X; RoHS: Yes; Category: Resistor Arrays; Stock: 748; Pricing: 1=0.29, 10=0.127, 50=0.127, 100=0.057, 1000=0.04, 10000=0.031 (USD); Thickness: 350um; ComponentLink1URL: http://www.onlinecomponents.com/datasheet/exb-14vr000x.aspx?p=44463385&src-supplier=Onlinecomponents.com; ComponentLink1Description: http://www.onlinecomponents.com/datasheet/exb-14vr000x.aspx?p=44463385&src-supplier=Onlinecomponents.com; ComponentLink2URL: http://www.mouser.com/ds/2/315/AOC0000C14-1108062.pdf?src-supplier=Mouser; ComponentLink2Description: http://www.mouser.com/ds/2/315/AOC0000C14-1108062.pdf?src-supplier=Mouser; ComponentLink3URL: https://datasheet.octopart.com/EXB14VR000X-Panasonic-datasheet-41578787.pdf?src-supplier=Future+Electronics; ComponentLink3Description: https://datasheet.octopart.com/EXB14VR000X-Panasonic-datasheet-41578787.pdf?src-supplier=Future+Electronics; ComponentLink4URL: https://datasheet.octopart.com/EXB-14VR000X-Panasonic-datasheet-118699.pdf?src-supplier=Digikey; ComponentLink4Description: https://datasheet.octopart.com/EXB-14VR000X-Panasonic-datasheet-118699.pdf?src-supplier=Digikey; ComponentLink5URL: http://industrial.panasonic.com/www-data/pdf/AOC0000/AOC0000CE1.pdf?src-supplier=Avnet; ComponentLink5Description: http://industrial.panasonic.com/www-data/pdf/AOC0000/AOC0000CE1.pdf?src-supplier=Avnet; ComponentLink6URL: https://datasheet.octopart.com/EXB-14VR000X-Panasonic-datasheet-154766207.pdf?src-supplier=Master+Electronics; ComponentLink6Description: https://datasheet.octopart.com/EXB-14VR000X-Panasonic-datasheet-154766207.pdf?src-supplier=Master+Electronics
pins: 1 B, 1 B, 2 A, 2 A

## Fiducial
designator F?  (value not drawn)
footprint Fiducial

## Fiducial_2
designator F?  (value not drawn)
footprint Fiducial_2

## FT232RL-REEL
designator U?
Integrated Circuit Interface USB-UART; RS-232; 12Mbs; 3.3-5.25V; -40+85 deg.C; SMD; SSOP28; Manufacturer: FTDI; Manufacturer Part Number: FT232RL-REEL; Data Rate: 60Mbps; Interface: UART, USB; Clock Frequency: 12.02MHz; Max Supply Current: 100µA; Max Supply Voltage: 5.25V; Min Supply Voltage: 3.3V; Number of Channels: 1; Operating Supply Current: 15mA; Operating Supply Voltage: 5V; Supplier: RS; Supplier Part Number: 406580; RoHS: Compliant; Category: UART Interface ICs; Pricing: 1=2.92, 20=2.61, 100=2.54, 500=2.47, 1000=2.41 (GBP); Ambient Temperature Range High: 85°C; Case/Package: SSOP; Country of Origin: Mainland China; Export Control Classification Number (ECCN) Code: EAR99; Height: 2mm; Height - Seated (Max): 2mm; Harmonized Tariff Schedule (HTS) Code: 8542.31.00.01; Introduction Date: 2008-08-04; Lead Free: Lead Free; Length: 10.2mm; Lifecycle Status: Obsolete; Max Operating Temperature: 85°C; Min Operating Temperature: -40°C; Mounting Technology: Surface Mount; Pins: 28; Number of Terminals: 28; Number of Transceivers: 1; Radiation Hardening: No; REACH SVHC: Yes; Schedule B: 8542390000; Temperature Grade: Industrial; Terminal Pitch: 650µm; Voltage: 5V; Weight: 2.26799g; Width: 5.3mm; ComponentLink1URL: https://datasheet.octopart.com:443/FT232RL-REEL-FTDI-datasheet-153645090.pdf?src-supplier=IHS; ComponentLink1Description: https://datasheet.octopart.com:443/FT232RL-REEL-FTDI-datasheet-153645090.pdf?src-supplier=IHS; ComponentLink2URL: https://datasheet.octopart.com:443/FT232RL-REEL-FTDI-datasheet-11992319.pdf?src-supplier=SHENGYU+ELECTRONICS; ComponentLink2Description: https://datasheet.octopart.com:443/FT232RL-REEL-FTDI-datasheet-11992319.pdf?src-supplier=SHENGYU+ELECTRONICS; ComponentLink3URL: https://datasheet.octopart.com:443/FT232RL-REEL-FTDI-datasheet-44209889.pdf?src-supplier=Newark; ComponentLink3Description: https://datasheet.octopart.com:443/FT232RL-REEL-FTDI-datasheet-44209889.pdf?src-supplier=Newark; ComponentLink4URL: https://datasheet.octopart.com:443/FT232RL-REEL-FTDI-datasheet-120501.pdf?src-supplier=Newark; ComponentLink4Description: https://datasheet.octopart.com:443/FT232RL-REEL-FTDI-datasheet-120501.pdf?src-supplier=Newark; ComponentLink5URL: https://datasheet.octopart.com:443/FT232RL-REEL-FTDI-datasheet-188868863.pdf?src-supplier=TME; ComponentLink5Description: https://datasheet.octopart.com:443/FT232RL-REEL-FTDI-datasheet-188868863.pdf?src-supplier=TME; ComponentLink6URL: https://datasheet.octopart.com:443/FT232RL-REEL-FTDI-datasheet-150509642.pdf?src-supplier=TME; ComponentLink6Description: https://datasheet.octopart.com:443/FT232RL-REEL-FTDI-datasheet-150509642.pdf?src-supplier=TME; ComponentLink7URL: https://datasheet.octopart.com:443/FT232RL-REEL-FTDI-datasheet-68321328.pdf?src-supplier=TME; ComponentLink7Description: https://datasheet.octopart.com:443/FT232RL-REEL-FTDI-datasheet-68321328.pdf?src-supplier=TME; ComponentLink8URL: https://datasheet.octopart.com:443/FT232RL-REEL-FTDI-datasheet-15949903.pdf?src-supplier=iiiC; ComponentLink8Description: https://datasheet.octopart.com:443/FT232RL-REEL-FTDI-datasheet-15949903.pdf?src-supplier=iiiC; ComponentLink9URL: https://datasheet.octopart.com:443/FT232RL-REEL-FTDI-datasheet-162802.pdf?src-supplier=RS+(Formerly+Allied+Electronics); ComponentLink9Description: https://datasheet.octopart.com:443/FT232RL-REEL-FTDI-datasheet-162802.pdf?src-supplier=RS+(Formerly+Allied+Electronics)
footprint IC28_SSOP-28_FTD
pins: 1 TXD, 2 DTR#, 3 RTS#, 4 VCCIO (power), 5 RXD, 6 RI#, 7 GND (power), 8 NC, 9 DSR#, 10 DCD#, 11 CTS#, 12 CBUS4 (io), 13 CBUS2 (io), 14 CBUS3 (io), 15 USBDP, 16 USBDM, 17 3V3OUT (out), 18 GND (power), 19 RESET#, 20 VCC (power), 21 GND (power), 22 CBUS1 (io), 23 CBUS0 (io), 24 NC, 25 AGND (power), 26 TEST, 27 OSCI, 28 OSCO

## FTSH-110-01-F-D-RA
designator J?  (value not drawn)
Conn Unshrouded Header HDR 20 POS 1.27mm Solder RA Side Entry Thru-Hole Tube; Manufacturer: Samtec; Manufacturer Part Number: FTSH-110-01-F-D-RA; Number of Contacts: 20; Gender: Male; Supplier: Avnet; Supplier Part Number: FTSH-110-01-F-D-RA; RoHS: Yes; Category: Connectors; Stock: 703; Pricing: 1=3.97000, 50=3.24000, 100=2.75000, 500=2.44000, 1000=1.80000 (USD); Contact Plating: Gold; Contact Material: Bronze; Housing Color: Black; Housing Material: Polymer; Min Operating Temperature: -55°C; Max Operating Temperature: 125°C; Number of Rows: 2; Termination: Solder; Packaging: Rail/Tube; Orientation: Right Angle; Length: 12.7mm; Pitch: 1.27mm; Depth: 8.1mm; RoHS Compliant: Yes; ComponentLink1URL: http://www.farnell.com/datasheets/2570365.pdf?src-supplier=Newark; ComponentLink1Description: http://www.farnell.com/datasheets/2570365.pdf?src-supplier=Newark; ComponentLink2URL: http://cloud.samtec.com/catalog_english/FTSH_TH.PDF?src-supplier=Avnet; ComponentLink2Description: http://cloud.samtec.com/catalog_english/FTSH_TH.PDF?src-supplier=Avnet; ComponentLink3URL: http://suddendocs.samtec.com/prints/ftsh-1xx-xx-xx-d-xx-xx-mkt.pdf?src-supplier=Digi-Key; ComponentLink3Description: http://suddendocs.samtec.com/prints/ftsh-1xx-xx-xx-d-xx-xx-mkt.pdf?src-supplier=Digi-Key
footprint FTSH-110-01-F-D-RA
pins: 1, 2, 3, 4, 5, 6, 7, 8, 9, 10, 11, 12, 13, 14, 15, 16, 17, 18, 19, 20
